# Altium footprint library ref-packages.PCBLIB: 1544 footprints (part 54 of 103)
Each footprint in its own frame and in the unit in brackets; x right, y up, seen from the top. Pads: shape width x height; smd on the part's side, far side on the other; paste and mask are expansions set on the pad; w line width, h text height; cw(c..) or ccw(c..) is an arc to the next point about the centre after c.
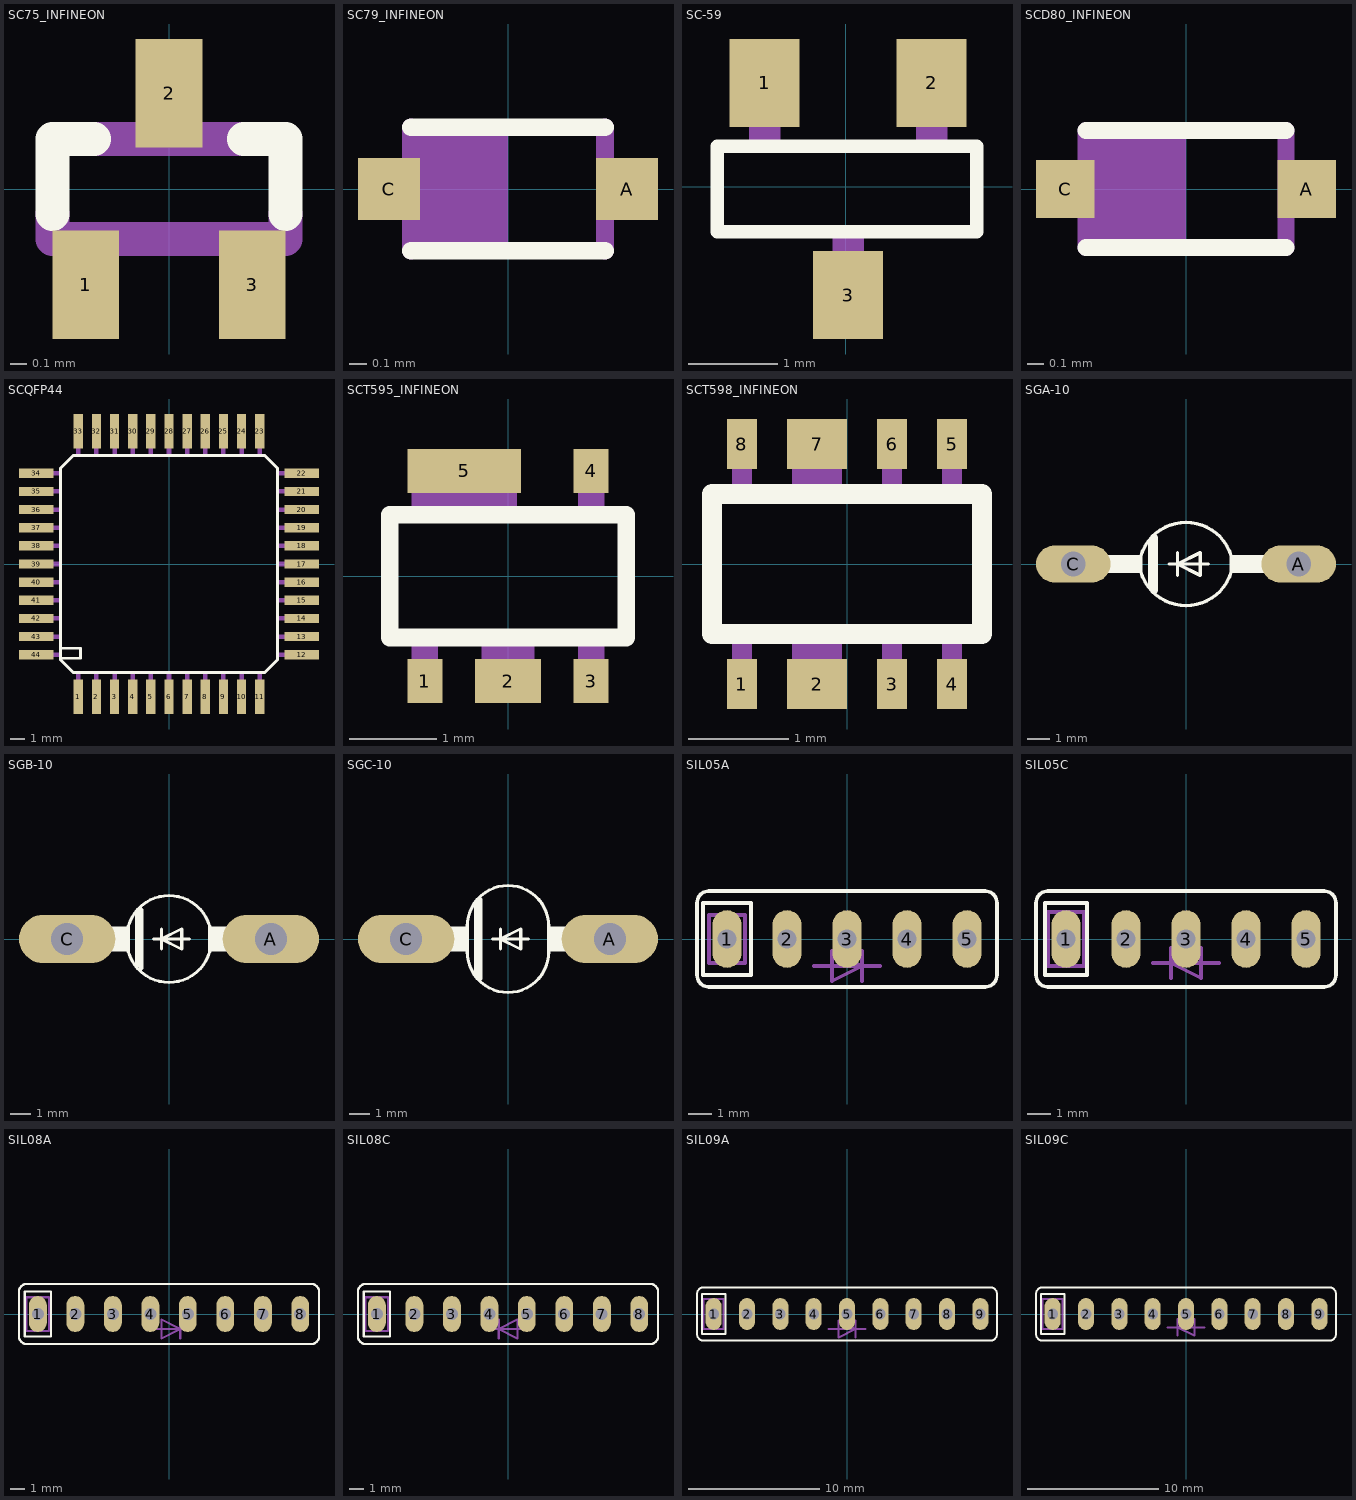
[diagram p53: the footprints below, top view; thin cyan lines are the x and y axes]

## SC75_INFINEON [mm]
pads (3):
  rect 0.4x0.65 smd: 1(-0.5,-0.575) 2(0,0.575) 3(0.5,-0.575)
Top Overlay:
  lines w0.203: -0.7,-0.15 -0.7,0.3 -0.45,0.3 ; 0.45,0.3 0.7,0.3 0.7,-0.15
Mechanical 16:
  rectangle: -0.6,-0.8 -0.4,-0.35
  rectangle: 0.4,-0.8 0.6,-0.35
  rectangle: -0.1,0.35 0.1,0.8
  lines w0.203: -0.7,-0.15 -0.7,-0.3 0.7,-0.3 0.7,-0.15 ; -0.45,0.3 0.45,0.3

## SC79_INFINEON [mm]
pads (2):
  rect 0.35x0.35 smd: A(0.675,0) C(-0.675,0)
Top Overlay:
  lines w0.102: -0.55,-0.35 0.55,-0.35 ; -0.55,0.35 0.55,0.35
Mechanical 16:
  rectangle: -0.8,-0.15 -0.55,0.15
  rectangle: 0.55,-0.15 0.8,0.15
  rectangle: -0.55,-0.35 0,0.35
  lines w0.102: -0.55,-0.35 -0.55,0.35 ; 0.55,-0.35 0.55,0.35

## SC-59 [mil]
pads (3):
  rect 31x39 smd: 1(-36,46) 2(38,46) 3(1,-48)
Top Overlay:
  lines w6: -57,-20 58,-20 58,18 -57,18 -57,-20
Mechanical 16:
  rectangle: 31,20 45,45
  rectangle: -6,-47 8,-22
  rectangle: -43,20 -29,45

## SCD80_INFINEON [mm]
pads (2):
  rect 0.35x0.35 smd: A(0.725,0) C(-0.725,0)
Top Overlay:
  lines w0.102: -0.6,-0.35 0.6,-0.35 ; -0.6,0.35 0.6,0.35
Mechanical 16:
  rectangle: -0.6,-0.35 0,0.35
  rectangle: -0.85,-0.15 -0.6,0.15
  rectangle: 0.6,-0.15 0.85,0.15
  lines w0.102: -0.6,-0.35 -0.6,0.35 ; 0.6,-0.35 0.6,0.35

## SCQFP44 [mm]
pads (44):
  rect 0.65x2.4 smd: 1(-6.35,-9.3) 2(-5.08,-9.3) 3(-3.81,-9.3) 4(-2.54,-9.3) 5(-1.27,-9.3) 6(0,-9.3) 7(1.27,-9.3) 8(2.54,-9.3) 9(3.81,-9.3) 10(5.08,-9.3) 11(6.35,-9.3) 23(6.35,9.3) 24(5.08,9.3) 25(3.81,9.3) 26(2.54,9.3) 27(1.27,9.3) 28(0,9.3) 29(-1.27,9.3) 30(-2.54,9.3) 31(-3.81,9.3) 32(-5.08,9.3) 33(-6.35,9.3)
  rect 2.4x0.65 smd: 12(9.3,-6.35) 13(9.3,-5.08) 14(9.3,-3.81) 15(9.3,-2.54) 16(9.3,-1.27) 17(9.3,0) 18(9.3,1.27) 19(9.3,2.54) 20(9.3,3.81) 21(9.3,5.08) 22(9.3,6.35) 34(-9.3,6.35) 35(-9.3,5.08) 36(-9.3,3.81) 37(-9.3,2.54) 38(-9.3,1.27) 39(-9.3,0) 40(-9.3,-1.27) 41(-9.3,-2.54) 42(-9.3,-3.81) 43(-9.3,-5.08) 44(-9.3,-6.35)
Top Overlay:
  lines w0.203: -7.5,-5.9 -6.2,-5.9 -6.2,-6.6 -7.6,-6.6 ; -7.6,-6.6 -7.6,6.7 -6.7,7.6 6.7,7.6 7.6,6.7 7.6,-6.7 6.7,-7.6 -6.7,-7.6 -7.6,-6.7 -7.6,-6.6
Mechanical 16:
  rectangle: -6.51,-10.1 -6.19,-7.6
  rectangle: -5.24,-10.1 -4.92,-7.6
  rectangle: -3.97,-10.1 -3.65,-7.6
  rectangle: -2.7,-10.1 -2.38,-7.6
  rectangle: -1.43,-10.1 -1.11,-7.6
  rectangle: -0.16,-10.1 0.16,-7.6
  rectangle: 1.11,-10.1 1.43,-7.6
  rectangle: 2.38,-10.1 2.7,-7.6
  rectangle: 3.65,-10.1 3.97,-7.6
  rectangle: 4.92,-10.1 5.24,-7.6
  rectangle: 6.19,-10.1 6.51,-7.6
  rectangle: 7.6,-6.51 10.1,-6.19
  rectangle: 7.6,-5.24 10.1,-4.92
  rectangle: 7.6,-3.97 10.1,-3.65
  rectangle: 7.6,-2.7 10.1,-2.38
  rectangle: 7.6,-1.43 10.1,-1.11
  rectangle: 7.6,-0.16 10.1,0.16
  rectangle: 7.6,1.11 10.1,1.43
  rectangle: 7.6,2.38 10.1,2.7
  rectangle: 7.6,3.65 10.1,3.97
  rectangle: 7.6,4.92 10.1,5.24
  rectangle: 7.6,6.19 10.1,6.51
  rectangle: 6.19,7.6 6.51,10.1
  rectangle: 4.92,7.6 5.24,10.1
  rectangle: 3.65,7.6 3.97,10.1
  rectangle: 2.38,7.6 2.7,10.1
  rectangle: 1.11,7.6 1.43,10.1
  rectangle: -0.16,7.6 0.16,10.1
  rectangle: -1.43,7.6 -1.11,10.1
  rectangle: -2.7,7.6 -2.38,10.1
  rectangle: -3.97,7.6 -3.65,10.1
  rectangle: -5.24,7.6 -4.92,10.1
  rectangle: -6.51,7.6 -6.19,10.1
  rectangle: -10.1,6.19 -7.6,6.51
  rectangle: -10.1,4.92 -7.6,5.24
  rectangle: -10.1,3.65 -7.6,3.97
  rectangle: -10.1,2.38 -7.6,2.7
  rectangle: -10.1,1.11 -7.6,1.43
  rectangle: -10.1,-0.16 -7.6,0.16
  rectangle: -10.1,-1.43 -7.6,-1.11
  rectangle: -10.1,-2.7 -7.6,-2.38
  rectangle: -10.1,-3.97 -7.6,-3.65
  rectangle: -10.1,-5.24 -7.6,-4.92
  rectangle: -10.1,-6.51 -7.6,-6.19

## SCT595_INFINEON [mil]
pads (5):
  rect 15.75x19.69 smd: 1(-37.4,-47.24) 3(37.4,-47.24) 4(37.4,47.24)
  rect 29.53x19.69 smd: 2(0,-47.24)
  rect 51.18x19.69 smd: 5(-19.69,47.24)
Top Overlay:
  lines w8: -53.15,-27.56 53.15,-27.56 53.15,27.56 -53.15,27.56 -53.15,-27.56
Mechanical 16:
  rectangle: -11.81,-51.18 11.81,-29.53
  rectangle: -43.31,-51.18 -31.5,-29.53
  rectangle: 31.5,-51.18 43.31,-29.53
  rectangle: 31.5,29.53 43.31,51.18
  rectangle: -43.31,29.53 3.94,51.18

## SCT598_INFINEON [mil]
pads (8):
  rect 11.81x19.69 smd: 1(-41.34,-47.24) 3(17.72,-47.24) 4(41.34,-47.24) 5(41.34,47.24) 6(17.72,47.24) 8(-41.34,47.24)
  rect 23.62x19.69 smd: 2(-11.81,-47.24) 7(-11.81,47.24)
Top Overlay:
  lines w8: -53.15,-27.56 53.15,-27.56 53.15,27.56 -53.15,27.56 -53.15,-27.56
Mechanical 16:
  rectangle: -45.28,-51.18 -37.4,-29.53
  rectangle: -21.65,-51.18 -1.97,-29.53
  rectangle: 13.78,-51.18 21.65,-29.53
  rectangle: 37.4,-51.18 45.28,-29.53
  rectangle: 37.4,29.53 45.28,51.18
  rectangle: 13.78,29.53 21.65,51.18
  rectangle: -21.65,29.53 -1.97,51.18
  rectangle: -45.28,29.53 -37.4,51.18

## SGA-10 [mil]
pads (2):
  oval 132x66 hole 44: A(200,0) C(-200,0)
Top Overlay:
  rectangle: 80,-16 152,16
  rectangle: -152,-16 -80,16
  lines w6: -30,0 -15,0 ; -15,-20 -15,0 ; -15,20 -15,0 ; 40,0 -15,0 ; -15,0 25,-20 25,20 -15,0 ; -80,-15 -80,15 cw(c0,-10) 80,15 80,-15 cw(c0,10) -80,-15
  lines w10: -62,-40 -62,41 ; -55,-47 -55,47
Mechanical 16:
  lines w32: -200,0 -125,0 ; 125,0 200,0

## SGB-10 [mil]
pads (2):
  oval 189x94.5 hole 63: A(200,0) C(-200,0)
Top Overlay:
  rectangle: -130,-25 -80,25
  rectangle: 80,-25 130,25
  lines w6: -30,0 -15,0 ; -15,-20 -15,0 ; -15,20 -15,0 ; 40,0 -15,0 ; -15,0 25,-20 25,20 -15,0 ; -80,-25 -80,25 cw(c0,2) 80,25 80,-25 cw(c0,-2) -80,-25
  lines w10: -62,-50 -62,51 ; -55,-57 -55,57
Mechanical 16:
  lines w50: -200,0 -125,0 ; 125,0 200,0

## SGC-10 [mil]
pads (2):
  oval 189x94.5 hole 63: A(200,0) C(-200,0)
Top Overlay:
  rectangle: -130,-25 -80,25
  rectangle: 80,-25 130,25
  lines w6: -30,0 -15,0 ; -15,-20 -15,0 ; -15,20 -15,0 ; 40,0 -15,0 ; -15,0 25,-20 25,20 -15,0 ; -80,-25 -80,25 cw(c0,25) 80,25 80,-25 cw(c0,-25) -80,-25
  lines w10: -62,-70 -62,70 ; -55,-77 -55,77
Mechanical 16:
  lines w50: -200,0 -125,0 ; 125,0 200,0

## SIL05A [mil]
pads (5):
  oval 48x96 hole 32: 1(-200,0) 2(-100,0) 3(0,0) 4(100,0) 5(200,0)
Top Overlay:
  lines w6: -250,-60 ccw(c-230,-60) -230,-80 230,-80 ccw(c230,-60) 250,-60 250,60 ccw(c230,60) 230,80 -230,80 ccw(c-230,60) -250,60 -250,-60 ; -240,-60 -160,-60 -160,60 -240,60 -240,-60
Mechanical 16:
  lines w6: -55,-45 -25,-45 ; 25,-70 25,-45 ; 25,-20 25,-45 ; 55,-45 25,-45 ; -25,-45 -25,-70 25,-45 ; -25,-45 -25,-20 25,-45 ; -25,-45 25,-45 ; -230,-40 -170,-40 -170,40 -230,40 -230,-40

## SIL05C [mil]
pads (5):
  oval 48x96 hole 32: 1(-200,0) 2(-100,0) 3(0,0) 4(100,0) 5(200,0)
Top Overlay:
  lines w6: -250,-60 ccw(c-230,-60) -230,-80 230,-80 ccw(c230,-60) 250,-60 250,60 ccw(c230,60) 230,80 -230,80 ccw(c-230,60) -250,60 -250,-60 ; -235,-60 -165,-60 -165,60 -235,60 -235,-60
Mechanical 16:
  lines w6: -55,-40 -25,-40 ; -25,-65 -25,-40 ; -25,-15 -25,-40 ; 55,-40 25,-40 ; -25,-40 25,-15 25,-40 ; -25,-40 25,-65 25,-40 ; -25,-40 25,-40 ; -230,-45 -170,-45 -170,45 -230,45 -230,-45

## SIL08A [mil]
pads (8):
  oval 48x96 hole 32: 1(-350,0) 2(-250,0) 3(-150,0) 4(-50,0) 5(50,0) 6(150,0) 7(250,0) 8(350,0)
Top Overlay:
  lines w6: -400,-60 ccw(c-380,-60) -380,-80 380,-80 ccw(c380,-60) 400,-60 400,60 ccw(c380,60) 380,80 -380,80 ccw(c-380,60) -400,60 -400,-60 ; -385,-60 -315,-60 -315,60 -385,60 -385,-60
Mechanical 16:
  lines w6: -50,-40 -20,-40 ; 30,-65 30,-40 ; 30,-15 30,-40 ; 60,-40 30,-40 ; -20,-40 -20,-65 30,-40 ; -20,-40 -20,-15 30,-40 ; -20,-40 30,-40 ; -380,-45 -320,-45 -320,45 -380,45 -380,-45

## SIL08C [mil]
pads (8):
  oval 48x96 hole 32: 1(-350,0) 2(-250,0) 3(-150,0) 4(-50,0) 5(50,0) 6(150,0) 7(250,0) 8(350,0)
Top Overlay:
  lines w6: -400,-60 ccw(c-380,-60) -380,-80 380,-80 ccw(c380,-60) 400,-60 400,60 ccw(c380,60) 380,80 -380,80 ccw(c-380,60) -400,60 -400,-60 ; -385,-60 -315,-60 -315,60 -385,60 -385,-60
Mechanical 16:
  lines w6: -55,-40 -25,-40 ; -25,-65 -25,-40 ; -25,-15 -25,-40 ; 55,-40 25,-40 ; -25,-40 25,-15 25,-40 ; -25,-40 25,-65 25,-40 ; -25,-40 25,-40 ; -380,-45 -320,-45 -320,45 -380,45 -380,-45

## SIL09A [mil]
pads (9):
  oval 48x96 hole 32: 1(-400,0) 2(-300,0) 3(-200,0) 4(-100,0) 5(0,0) 6(100,0) 7(200,0) 8(300,0) 9(400,0)
Top Overlay:
  lines w6: -450,-60 ccw(c-430,-60) -430,-80 430,-80 ccw(c430,-60) 450,-60 450,60 ccw(c430,60) 430,80 -430,80 ccw(c-430,60) -450,60 -450,-60 ; -435,-60 -365,-60 -365,60 -435,60 -435,-60
Mechanical 16:
  lines w6: -55,-45 -25,-45 ; 25,-70 25,-45 ; 25,-20 25,-45 ; 55,-45 25,-45 ; -25,-45 -25,-70 25,-45 ; -25,-45 -25,-20 25,-45 ; -25,-45 25,-45 ; -430,-45 -370,-45 -370,45 -430,45 -430,-45

## SIL09C [mil]
pads (9):
  oval 48x96 hole 32: 1(-400,0) 2(-300,0) 3(-200,0) 4(-100,0) 5(0,0) 6(100,0) 7(200,0) 8(300,0) 9(400,0)
Top Overlay:
  lines w6: -450,-60 ccw(c-430,-60) -430,-80 430,-80 ccw(c430,-60) 450,-60 450,60 ccw(c430,60) 430,80 -430,80 ccw(c-430,60) -450,60 -450,-60 ; -435,-60 -365,-60 -365,60 -435,60 -435,-60
Mechanical 16:
  lines w6: -55,-40 -25,-40 ; -25,-65 -25,-40 ; -25,-15 -25,-40 ; 55,-40 25,-40 ; -25,-40 25,-15 25,-40 ; -25,-40 25,-65 25,-40 ; -25,-40 25,-40 ; -430,-45 -370,-45 -370,45 -430,45 -430,-45